# Altium footprint library texas.PCBLIB: 168 footprints (part 9 of 14)
Each footprint in its own frame and in the unit in brackets; x right, y up, seen from the top. Pads: shape width x height; smd on the part's side, far side on the other; paste and mask are expansions set on the pad; w line width, h text height; cw(c..) or ccw(c..) is an arc to the next point about the centre after c.
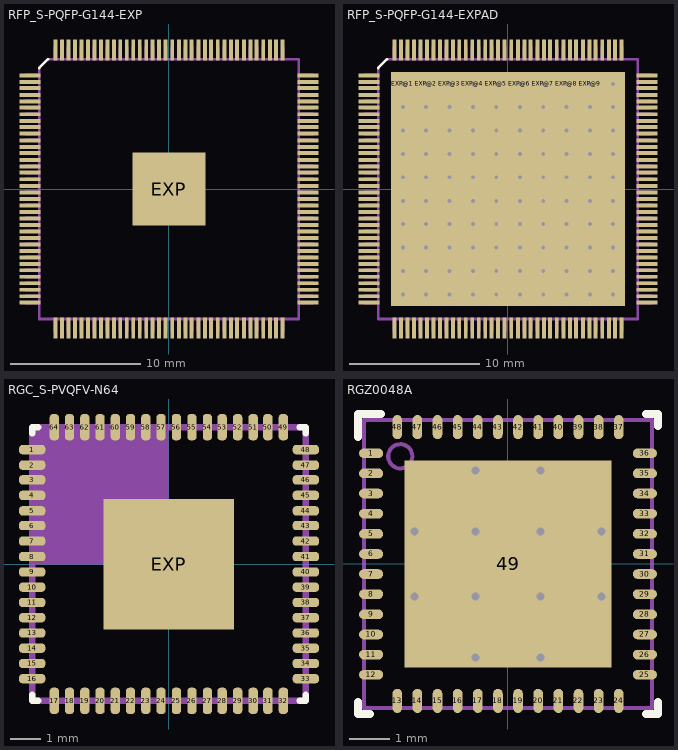
[diagram p8: the footprints below, top view; thin cyan lines are the x and y axes]

## RFP_S-PQFP-G144-EXP [mil]
pads (145):
  rect 63x12 smd: 1(-421.26,345) 2(-421.26,325) 3(-421.26,306) 4(-421.26,286) 5(-421.26,266) 6(-421.26,247) 7(-421.26,227) 8(-421.26,207) 9(-421.26,188) 10(-421.26,168) 11(-421.26,148) 12(-421.26,128) 13(-421.26,109) 14(-421.26,89) 15(-421.26,69) 16(-421.26,50) 17(-421.26,30) 18(-421.26,10) 19(-421.26,-9.84) 20(-421.26,-29.53) 21(-421.26,-49.21) 22(-421.26,-68.9) 23(-421.26,-88.58) 24(-421.26,-108.27) 25(-421.26,-127.95) 26(-421.26,-147.64) 27(-421.26,-167.32) 28(-421.26,-187.01) 29(-421.26,-206.69) 30(-421.26,-226.38) 31(-421.26,-246.06) 32(-421.26,-265.75) 33(-421.26,-285.43) 34(-421.26,-305.12) 35(-421.26,-324.8) 36(-421.26,-344.49) 73(422,-344.49) 74(422,-324.8) 75(422,-305.12) 76(422,-285.43) 77(422,-265.75) 78(422,-246.06) 79(422,-226.38) 80(422,-206.69) 81(422,-187.01) 82(422,-167.32) 83(422,-147.64) 84(422,-127.95) 85(422,-108.27) 86(422,-88.58) 87(422,-68.9) 88(422,-49.21) 89(422,-29.53) 90(422,-9.84) 91(422,10) 92(422,30) 93(422,50) 94(422,69) 95(422,89) 96(422,109) 97(422,128) 98(422,148) 99(422,168) 100(422,188) 101(422,207) 102(422,227) 103(422,247) 104(422,266) 105(422,286) 106(422,306) 107(422,325) 108(422,345)
  rect 12x63 smd: 37(-344.49,-421.26) 38(-324.8,-421.26) 39(-305.12,-421.26) 40(-285.43,-421.26) 41(-265.75,-421.26) 42(-246.06,-421.26) 43(-226.38,-421.26) 44(-206.69,-421.26) 45(-187.01,-421.26) 46(-167.32,-421.26) 47(-147.64,-421.26) 48(-127.95,-421.26) 49(-108.27,-421.26) 50(-88.58,-421.26) 51(-68.9,-421.26) 52(-49.21,-421.26) 53(-29.53,-421.26) 54(-9.84,-421.26) 55(10,-421.26) 56(30,-421.26) 57(50,-421.26) 58(69,-421.26) 59(89,-421.26) 60(109,-421.26) 61(128,-421.26) 62(148,-421.26) 63(168,-421.26) 64(188,-421.26) 65(207,-421.26) 66(227,-421.26) 67(247,-421.26) 68(266,-421.26) 69(286,-421.26) 70(306,-421.26) 71(325,-421.26) 72(345,-421.26) 109(345,422) 110(325,422) 111(306,422) 112(286,422) 113(266,422) 114(247,422) 115(227,422) 116(207,422) 117(188,422) 118(168,422) 119(148,422) 120(128,422) 121(109,422) 122(89,422) 123(69,422) 124(50,422) 125(30,422) 126(10,422) 127(-9.84,422) 128(-29.53,422) 129(-49.21,422) 130(-68.9,422) 131(-88.58,422) 132(-108.27,422) 133(-127.95,422) 134(-147.64,422) 135(-167.32,422) 136(-187.01,422) 137(-206.69,422) 138(-226.38,422) 139(-246.06,422) 140(-265.75,422) 141(-285.43,422) 142(-305.12,422) 143(-324.8,422) 144(-344.49,422)
  rect 221x221 smd: EXP(0,0)
Top Overlay:
  lines w8: -393.64,367 -366.14,394
Top Paste:
  rectangle: -108.27,-108.27 109,110
  region: -349.49,451.53 -349.49,392.47 -339.49,392.47 -339.49,451.53
  region: -329.8,451.53 -329.8,392.47 -319.8,392.47 -319.8,451.53
  region: -310.12,451.53 -310.12,392.47 -300.12,392.47 -300.12,451.53
  region: -290.43,451.53 -290.43,392.47 -280.43,392.47 -280.43,451.53
  region: -270.75,451.53 -270.75,392.47 -260.75,392.47 -260.75,451.53
  region: -251.06,451.53 -251.06,392.47 -241.06,392.47 -241.06,451.53
  region: -231.38,451.53 -231.38,392.47 -221.38,392.47 -221.38,451.53
  region: -211.69,451.53 -211.69,392.47 -201.69,392.47 -201.69,451.53
  region: -192.01,451.53 -192.01,392.47 -182.01,392.47 -182.01,451.53
  region: -172.32,451.53 -172.32,392.47 -162.32,392.47 -162.32,451.53
  region: -152.64,451.53 -152.64,392.47 -142.64,392.47 -142.64,451.53
  region: -132.95,451.53 -132.95,392.47 -122.95,392.47 -122.95,451.53
  region: -113.27,451.53 -113.27,392.47 -103.27,392.47 -103.27,451.53
  region: -93.58,451.53 -93.58,392.47 -83.58,392.47 -83.58,451.53
  region: -73.9,451.53 -73.9,392.47 -63.9,392.47 -63.9,451.53
  region: -54.21,451.53 -54.21,392.47 -44.21,392.47 -44.21,451.53
  region: -34.53,451.53 -34.53,392.47 -24.53,392.47 -24.53,451.53
  region: -14.69,451.69 -14.69,392.31 -4.69,392.31 -4.69,451.69
  region: 5.16,451.84 5.16,392.16 15.16,392.16 15.16,451.84
  region: 25,452 25,392 35,392 35,452
  region: 44.5,451.5 44.5,392.5 54.5,392.5 54.5,451.5
  region: 64.5,451.5 64.5,392.5 74.5,392.5 74.5,451.5
  region: 84.5,451.5 84.5,392.5 94.5,392.5 94.5,451.5
  region: 103.5,451.5 103.5,392.5 113.5,392.5 113.5,451.5
  region: 123.5,451.5 123.5,392.5 133.5,392.5 133.5,451.5
  region: 143.5,451.5 143.5,392.5 153.5,392.5 153.5,451.5
  region: 162.5,451.5 162.5,392.5 172.5,392.5 172.5,451.5
  region: 182.5,451.5 182.5,392.5 192.5,392.5 192.5,451.5
  region: 202.5,451.5 202.5,392.5 212.5,392.5 212.5,451.5
  region: 221.5,451.5 221.5,392.5 231.5,392.5 231.5,451.5
  region: 241.5,451.5 241.5,392.5 251.5,392.5 251.5,451.5
  region: 261.5,451.5 261.5,392.5 271.5,392.5 271.5,451.5
  region: 280.5,451.5 280.5,392.5 290.5,392.5 290.5,451.5
  region: 300.5,451.5 300.5,392.5 310.5,392.5 310.5,451.5
  region: 320.5,451.5 320.5,392.5 330.5,392.5 330.5,451.5
  region: 340,452 340,392 350,392 350,452
  region: 451,350 392,350 392,340 451,340
  region: 451,330 392,330 392,320 451,320
  region: 451,311 392,311 392,301 451,301
  region: 451,291 392,291 392,281 451,281
  region: 451,271 392,271 392,261 451,261
  region: 451,251 392,251 392,242 451,242
  region: 451,232 392,232 392,222 451,222
  region: 451,212 392,212 392,202 451,202
  region: 451,192 392,192 392,183 451,183
  region: 451,173 392,173 392,163 451,163
  region: 451,153 392,153 392,143 451,143
  region: 451,133 392,133 392,124 451,124
  region: 451,114 392,114 392,104 451,104
  region: 451,94 392,94 392,84 451,84
  region: 451,74 392,74 392,64 451,64
  region: 451,55 392,55 392,45 451,45
  region: 451,35 392,35 392,25 451,25
  region: 451,15 392,15 392,5 451,5
  region: 451,-4.92 392,-4.92 392,-14.76 451,-14.76
  region: 451,-24.61 392,-24.61 392,-34.45 451,-34.45
  region: 451,-44.29 392,-44.29 392,-54.13 451,-54.13
  region: 451,-63.98 392,-63.98 392,-73.82 451,-73.82
  region: 451,-83.66 392,-83.66 392,-93.5 451,-93.5
  region: 451,-103.35 392,-103.35 392,-113.19 451,-113.19
  region: 451,-123.03 392,-123.03 392,-132.87 451,-132.87
  region: 451,-142.72 392,-142.72 392,-152.56 451,-152.56
  region: 451,-162.4 392,-162.4 392,-172.24 451,-172.24
  region: 451,-182.09 392,-182.09 392,-191.93 451,-191.93
  region: 451,-201.77 392,-201.77 392,-211.61 451,-211.61
  region: 451,-221.46 392,-221.46 392,-231.3 451,-231.3
  region: 451,-241.14 392,-241.14 392,-250.98 451,-250.98
  region: 451,-260.83 392,-260.83 392,-270.67 451,-270.67
  region: 451,-280.51 392,-280.51 392,-290.35 451,-290.35
  region: 451,-300.2 392,-300.2 392,-310.04 451,-310.04
  region: 451,-319.88 392,-319.88 392,-329.72 451,-329.72
  region: 451,-339.57 392,-339.57 392,-349.41 451,-349.41
  region: 349.92,-451.26 349.92,-391.26 340.08,-391.26 340.08,-451.26
  region: 330.42,-450.76 330.42,-391.76 320.58,-391.76 320.58,-450.76
  region: 310.42,-450.76 310.42,-391.76 300.58,-391.76 300.58,-450.76
  region: 290.42,-450.76 290.42,-391.76 280.58,-391.76 280.58,-450.76
  region: 271.42,-450.76 271.42,-391.76 261.58,-391.76 261.58,-450.76
  region: 251.42,-450.76 251.42,-391.76 241.58,-391.76 241.58,-450.76
  region: 231.42,-450.76 231.42,-391.76 221.58,-391.76 221.58,-450.76
  region: 212.42,-450.76 212.42,-391.76 202.58,-391.76 202.58,-450.76
  region: 192.42,-450.76 192.42,-391.76 182.58,-391.76 182.58,-450.76
  region: 172.42,-450.76 172.42,-391.76 162.58,-391.76 162.58,-450.76
  region: 153.42,-450.76 153.42,-391.76 143.58,-391.76 143.58,-450.76
  region: 133.42,-450.76 133.42,-391.76 123.58,-391.76 123.58,-450.76
  region: 113.42,-450.76 113.42,-391.76 103.58,-391.76 103.58,-450.76
  region: 94.42,-450.76 94.42,-391.76 84.58,-391.76 84.58,-450.76
  region: 74.42,-450.76 74.42,-391.76 64.58,-391.76 64.58,-450.76
  region: 54.42,-450.76 54.42,-391.76 44.58,-391.76 44.58,-450.76
  region: 34.92,-451.26 34.92,-391.26 25.08,-391.26 25.08,-451.26
  region: 15.08,-451.1 15.08,-391.42 5.24,-391.42 5.24,-451.1
  region: -4.76,-450.94 -4.76,-391.57 -14.61,-391.57 -14.61,-450.94
  region: -24.61,-450.79 -24.61,-391.73 -34.45,-391.73 -34.45,-450.79
  region: -44.29,-450.79 -44.29,-391.73 -54.13,-391.73 -54.13,-450.79
  region: -63.98,-450.79 -63.98,-391.73 -73.82,-391.73 -73.82,-450.79
  region: -83.66,-450.79 -83.66,-391.73 -93.5,-391.73 -93.5,-450.79
  region: -103.35,-450.79 -103.35,-391.73 -113.19,-391.73 -113.19,-450.79
  region: -123.03,-450.79 -123.03,-391.73 -132.87,-391.73 -132.87,-450.79
  region: -142.72,-450.79 -142.72,-391.73 -152.56,-391.73 -152.56,-450.79
  region: -162.4,-450.79 -162.4,-391.73 -172.24,-391.73 -172.24,-450.79
  region: -182.09,-450.79 -182.09,-391.73 -191.93,-391.73 -191.93,-450.79
  region: -201.77,-450.79 -201.77,-391.73 -211.61,-391.73 -211.61,-450.79
  region: -221.46,-450.79 -221.46,-391.73 -231.3,-391.73 -231.3,-450.79
  region: -241.14,-450.79 -241.14,-391.73 -250.98,-391.73 -250.98,-450.79
  region: -260.83,-450.79 -260.83,-391.73 -270.67,-391.73 -270.67,-450.79
  region: -280.51,-450.79 -280.51,-391.73 -290.35,-391.73 -290.35,-450.79
  region: -300.2,-450.79 -300.2,-391.73 -310.04,-391.73 -310.04,-450.79
  region: -319.88,-450.79 -319.88,-391.73 -329.72,-391.73 -329.72,-450.79
  region: -339.57,-450.79 -339.57,-391.73 -349.41,-391.73 -349.41,-450.79
  rectangle: -450.79,-349.41 -391.73,-339.57
  rectangle: -450.79,-329.72 -391.73,-319.88
  rectangle: -450.79,-310.04 -391.73,-300.2
  rectangle: -450.79,-290.35 -391.73,-280.51
  rectangle: -450.79,-270.67 -391.73,-260.83
  rectangle: -450.79,-250.98 -391.73,-241.14
  rectangle: -450.79,-231.3 -391.73,-221.46
  rectangle: -450.79,-211.61 -391.73,-201.77
  rectangle: -450.79,-191.93 -391.73,-182.09
  rectangle: -450.79,-172.24 -391.73,-162.4
  rectangle: -450.79,-152.56 -391.73,-142.72
  rectangle: -450.79,-132.87 -391.73,-123.03
  rectangle: -450.79,-113.19 -391.73,-103.35
  rectangle: -450.79,-93.5 -391.73,-83.66
  rectangle: -450.79,-73.82 -391.73,-63.98
  rectangle: -450.79,-54.13 -391.73,-44.29
  rectangle: -450.79,-34.45 -391.73,-24.61
  rectangle: -450.79,-14.76 -391.73,-4.92
  rectangle: -450.79,5 -391.73,15
  rectangle: -450.79,25 -391.73,35
  rectangle: -450.79,45 -391.73,55
  rectangle: -450.79,64 -391.73,74
  rectangle: -450.79,84 -391.73,94
  rectangle: -450.79,104 -391.73,114
  rectangle: -450.79,124 -391.73,133
  rectangle: -450.79,143 -391.73,153
  rectangle: -450.79,163 -391.73,173
  rectangle: -450.79,183 -391.73,192
  rectangle: -450.79,202 -391.73,212
  rectangle: -450.79,222 -391.73,232
  rectangle: -450.79,242 -391.73,251
  rectangle: -450.79,261 -391.73,271
  rectangle: -450.79,281 -391.73,291
  rectangle: -450.79,301 -391.73,311
  rectangle: -450.79,320 -391.73,330
  rectangle: -450.79,340 -391.73,350
Top Solder:
  rectangle: -114.17,-114.17 115,115
  region: -351.49,454.97 -351.49,389.03 -337.49,389.03 -337.49,454.97
  region: -331.8,454.97 -331.8,389.03 -317.8,389.03 -317.8,454.97
  region: -312.12,454.97 -312.12,389.03 -298.12,389.03 -298.12,454.97
  region: -292.43,454.97 -292.43,389.03 -278.43,389.03 -278.43,454.97
  region: -272.75,454.97 -272.75,389.03 -258.75,389.03 -258.75,454.97
  region: -253.06,454.97 -253.06,389.03 -239.06,389.03 -239.06,454.97
  region: -233.38,454.97 -233.38,389.03 -219.38,389.03 -219.38,454.97
  region: -213.69,454.97 -213.69,389.03 -199.69,389.03 -199.69,454.97
  region: -194.01,454.97 -194.01,389.03 -180.01,389.03 -180.01,454.97
  region: -174.32,454.97 -174.32,389.03 -160.32,389.03 -160.32,454.97
  region: -154.64,454.97 -154.64,389.03 -140.64,389.03 -140.64,454.97
  region: -134.95,454.97 -134.95,389.03 -120.95,389.03 -120.95,454.97
  region: -115.27,454.97 -115.27,389.03 -101.27,389.03 -101.27,454.97
  region: -95.58,454.97 -95.58,389.03 -81.58,389.03 -81.58,454.97
  region: -75.9,454.97 -75.9,389.03 -61.9,389.03 -61.9,454.97
  region: -56.21,454.97 -56.21,389.03 -42.21,389.03 -42.21,454.97
  region: -36.25,455.25 -36.25,388.75 -22.25,388.75 -22.25,455.25
  region: -16.41,455.41 -16.41,388.59 -2.41,388.59 -2.41,455.41
  region: 2.94,455.06 2.94,388.94 16.94,388.94 16.94,455.06
  region: 22.78,455.22 22.78,388.78 36.78,388.78 36.78,455.22
  region: 43,455 43,389 57,389 57,455
  region: 62,455 62,389 76,389 76,455
  region: 82,455 82,389 96,389 96,455
  region: 102,455 102,389 116,389 116,455
  region: 121,455 121,389 135,389 135,455
  region: 141,455 141,389 155,389 155,455
  region: 161,455 161,389 175,389 175,455
  region: 180.5,454.5 180.5,389.5 194.5,389.5 194.5,454.5
  region: 200,455 200,389 214,389 214,455
  region: 220,455 220,389 234,389 234,455
  region: 240,455 240,389 254,389 254,455
  region: 259,455 259,389 273,389 273,455
  region: 279,455 279,389 293,389 293,455
  region: 299,455 299,389 313,389 313,455
  region: 318,455 318,389 332,389 332,455
  region: 338,455 338,389 352,389 352,455
  region: 455,352 389,352 389,338 455,338
  region: 455,332 389,332 389,318 455,318
  region: 455,313 389,313 389,299 455,299
  region: 455,293 389,293 389,279 455,279
  region: 455,273 389,273 389,259 455,259
  region: 455,253 389,253 389,240 455,240
  region: 455,234 389,234 389,220 455,220
  region: 455,214 389,214 389,200 455,200
  region: 455,194 389,194 389,181 455,181
  region: 455,175 389,175 389,161 455,161
  region: 455,155 389,155 389,141 455,141
  region: 455,135 389,135 389,122 455,122
  region: 455,116 389,116 389,102 455,102
  region: 455,96 389,96 389,82 455,82
  region: 455,76 389,76 389,63 455,63
  region: 455,57 389,57 389,43 455,43
  region: 455,37 389,37 389,23 455,23
  region: 455,17 389,17 389,3 455,3
  region: 455,-2.95 389,-2.95 389,-16.73 455,-16.73
  region: 455,-22.64 389,-22.64 389,-36.42 455,-36.42
  region: 455,-42.32 389,-42.32 389,-56.1 455,-56.1
  region: 455,-62.01 389,-62.01 389,-75.79 455,-75.79
  region: 455,-81.69 389,-81.69 389,-95.47 455,-95.47
  region: 455,-101.38 389,-101.38 389,-115.16 455,-115.16
  region: 455,-121.06 389,-121.06 389,-134.84 455,-134.84
  region: 455,-140.75 389,-140.75 389,-154.53 455,-154.53
  region: 455,-160.43 389,-160.43 389,-174.21 455,-174.21
  region: 455,-180.12 389,-180.12 389,-193.9 455,-193.9
  region: 455,-199.8 389,-199.8 389,-213.58 455,-213.58
  region: 455,-219.49 389,-219.49 389,-233.27 455,-233.27
  region: 455,-239.17 389,-239.17 389,-252.95 455,-252.95
  region: 455,-258.86 389,-258.86 389,-272.64 455,-272.64
  region: 455,-278.54 389,-278.54 389,-292.32 455,-292.32
  region: 455,-298.23 389,-298.23 389,-312.01 455,-312.01
  region: 455,-317.91 389,-317.91 389,-331.69 455,-331.69
  region: 455,-337.6 389,-337.6 389,-351.38 455,-351.38
  region: 351.89,-454.75 351.89,-388.75 338.11,-388.75 338.11,-454.75
  region: 331.89,-454.75 331.89,-388.75 318.11,-388.75 318.11,-454.75
  region: 312.89,-454.75 312.89,-388.75 299.11,-388.75 299.11,-454.75
  region: 292.89,-454.75 292.89,-388.75 279.11,-388.75 279.11,-454.75
  region: 272.89,-454.75 272.89,-388.75 259.11,-388.75 259.11,-454.75
  region: 253.89,-454.75 253.89,-388.75 240.11,-388.75 240.11,-454.75
  region: 233.89,-454.75 233.89,-388.75 220.11,-388.75 220.11,-454.75
  region: 213.89,-454.75 213.89,-388.75 200.11,-388.75 200.11,-454.75
  region: 194.39,-454.25 194.39,-389.25 180.61,-389.25 180.61,-454.25
  region: 174.89,-454.75 174.89,-388.75 161.11,-388.75 161.11,-454.75
  region: 154.89,-454.75 154.89,-388.75 141.11,-388.75 141.11,-454.75
  region: 134.89,-454.75 134.89,-388.75 121.11,-388.75 121.11,-454.75
  region: 115.89,-454.75 115.89,-388.75 102.11,-388.75 102.11,-454.75
  region: 95.89,-454.75 95.89,-388.75 82.11,-388.75 82.11,-454.75
  region: 75.89,-454.75 75.89,-388.75 62.11,-388.75 62.11,-454.75
  region: 56.89,-454.75 56.89,-388.75 43.11,-388.75 43.11,-454.75
  region: 36.67,-454.97 36.67,-388.53 22.89,-388.53 22.89,-454.97
  region: 16.82,-454.82 16.82,-388.69 3.05,-388.69 3.05,-454.82
  region: -2.52,-455.16 -2.52,-388.34 -16.3,-388.34 -16.3,-455.16
  region: -22.36,-455 -22.36,-388.5 -36.14,-388.5 -36.14,-455
  region: -42.32,-454.72 -42.32,-388.78 -56.1,-388.78 -56.1,-454.72
  region: -62.01,-454.72 -62.01,-388.78 -75.79,-388.78 -75.79,-454.72
  region: -81.69,-454.72 -81.69,-388.78 -95.47,-388.78 -95.47,-454.72
  region: -101.38,-454.72 -101.38,-388.78 -115.16,-388.78 -115.16,-454.72
  region: -121.06,-454.72 -121.06,-388.78 -134.84,-388.78 -134.84,-454.72
  region: -140.75,-454.72 -140.75,-388.78 -154.53,-388.78 -154.53,-454.72
  region: -160.43,-454.72 -160.43,-388.78 -174.21,-388.78 -174.21,-454.72
  region: -180.12,-454.72 -180.12,-388.78 -193.9,-388.78 -193.9,-454.72
  region: -199.8,-454.72 -199.8,-388.78 -213.58,-388.78 -213.58,-454.72
  region: -219.49,-454.72 -219.49,-388.78 -233.27,-388.78 -233.27,-454.72
  region: -239.17,-454.72 -239.17,-388.78 -252.95,-388.78 -252.95,-454.72
  region: -258.86,-454.72 -258.86,-388.78 -272.64,-388.78 -272.64,-454.72
  region: -278.54,-454.72 -278.54,-388.78 -292.32,-388.78 -292.32,-454.72
  region: -298.23,-454.72 -298.23,-388.78 -312.01,-388.78 -312.01,-454.72
  region: -317.91,-454.72 -317.91,-388.78 -331.69,-388.78 -331.69,-454.72
  region: -337.6,-454.72 -337.6,-388.78 -351.38,-388.78 -351.38,-454.72
  rectangle: -454.72,-351.38 -388.78,-337.6
  rectangle: -454.72,-331.69 -388.78,-317.91
  rectangle: -454.72,-312.01 -388.78,-298.23
  rectangle: -454.72,-292.32 -388.78,-278.54
  rectangle: -454.72,-272.64 -388.78,-258.86
  rectangle: -454.72,-252.95 -388.78,-239.17
  rectangle: -454.72,-233.27 -388.78,-219.49
  rectangle: -454.72,-213.58 -388.78,-199.8
  rectangle: -454.72,-193.9 -388.78,-180.12
  rectangle: -454.72,-174.21 -388.78,-160.43
  rectangle: -454.72,-154.53 -388.78,-140.75
  rectangle: -454.72,-134.84 -388.78,-121.06
  rectangle: -454.72,-115.16 -388.78,-101.38
  rectangle: -454.72,-95.47 -388.78,-81.69
  rectangle: -454.72,-75.79 -388.78,-62.01
  rectangle: -454.72,-56.1 -388.78,-42.32
  rectangle: -454.72,-36.42 -388.78,-22.64
  rectangle: -454.72,-16.73 -388.78,-2.95
  rectangle: -454.72,3 -388.78,17
  rectangle: -454.72,23 -388.78,37
  rectangle: -454.72,43 -388.78,57
  rectangle: -454.72,63 -388.78,76
  rectangle: -454.72,82 -388.78,96
  rectangle: -454.72,102 -388.78,116
  rectangle: -454.72,122 -388.78,135
  rectangle: -454.72,141 -388.78,155
  rectangle: -454.72,161 -388.78,175
  rectangle: -454.72,181 -388.78,194
  rectangle: -454.72,200 -388.78,214
  rectangle: -454.72,220 -388.78,234
  rectangle: -454.72,240 -388.78,253
  rectangle: -454.72,259 -388.78,273
  rectangle: -454.72,279 -388.78,293
  rectangle: -454.72,299 -388.78,313
  rectangle: -454.72,318 -388.78,332
  rectangle: -454.72,338 -388.78,352
Mechanical 4:
  drawing of 220 lines, arcs and shapes, not listed

## RFP_S-PQFP-G144-EXPAD [mil]
pads (244):
  rect 63x12 smd: 1(-421.26,345) 2(-421.26,325) 3(-421.26,306) 4(-421.26,286) 5(-421.26,266) 6(-421.26,247) 7(-421.26,227) 8(-421.26,207) 9(-421.26,188) 10(-421.26,168) 11(-421.26,148) 12(-421.26,128) 13(-421.26,109) 14(-421.26,89) 15(-421.26,69) 16(-421.26,50) 17(-421.26,30) 18(-421.26,10) 19(-421.26,-9.84) 20(-421.26,-29.53) 21(-421.26,-49.21) 22(-421.26,-68.9) 23(-421.26,-88.58) 24(-421.26,-108.27) 25(-421.26,-127.95) 26(-421.26,-147.64) 27(-421.26,-167.32) 28(-421.26,-187.01) 29(-421.26,-206.69) 30(-421.26,-226.38) 31(-421.26,-246.06) 32(-421.26,-265.75) 33(-421.26,-285.43) 34(-421.26,-305.12) 35(-421.26,-324.8) 36(-421.26,-344.49) 73(422,-344.49) 74(422,-324.8) 75(422,-305.12) 76(422,-285.43) 77(422,-265.75) 78(422,-246.06) 79(422,-226.38) 80(422,-206.69) 81(422,-187.01) 82(422,-167.32) 83(422,-147.64) 84(422,-127.95) 85(422,-108.27) 86(422,-88.58) 87(422,-68.9) 88(422,-49.21) 89(422,-29.53) 90(422,-9.84) 91(422,10) 92(422,30) 93(422,50) 94(422,69) 95(422,89) 96(422,109) 97(422,128) 98(422,148) 99(422,168) 100(422,188) 101(422,207) 102(422,227) 103(422,247) 104(422,266) 105(422,286) 106(422,306) 107(422,325) 108(422,345)
  rect 12x63 smd: 37(-344.49,-421.26) 38(-324.8,-421.26) 39(-305.12,-421.26) 40(-285.43,-421.26) 41(-265.75,-421.26) 42(-246.06,-421.26) 43(-226.38,-421.26) 44(-206.69,-421.26) 45(-187.01,-421.26) 46(-167.32,-421.26) 47(-147.64,-421.26) 48(-127.95,-421.26) 49(-108.27,-421.26) 50(-88.58,-421.26) 51(-68.9,-421.26) 52(-49.21,-421.26) 53(-29.53,-421.26) 54(-9.84,-421.26) 55(10,-421.26) 56(30,-421.26) 57(50,-421.26) 58(69,-421.26) 59(89,-421.26) 60(109,-421.26) 61(128,-421.26) 62(148,-421.26) 63(168,-421.26) 64(188,-421.26) 65(207,-421.26) 66(227,-421.26) 67(247,-421.26) 68(266,-421.26) 69(286,-421.26) 70(306,-421.26) 71(325,-421.26) 72(345,-421.26) 109(345,422) 110(325,422) 111(306,422) 112(286,422) 113(266,422) 114(247,422) 115(227,422) 116(207,422) 117(188,422) 118(168,422) 119(148,422) 120(128,422) 121(109,422) 122(89,422) 123(69,422) 124(50,422) 125(30,422) 126(10,422) 127(-9.84,422) 128(-29.53,422) 129(-49.21,422) 130(-68.9,422) 131(-88.58,422) 132(-108.27,422) 133(-127.95,422) 134(-147.64,422) 135(-167.32,422) 136(-187.01,422) 137(-206.69,422) 138(-226.38,422) 139(-246.06,422) 140(-265.75,422) 141(-285.43,422) 142(-305.12,422) 143(-324.8,422) 144(-344.49,422)
  rect 71x71 hole 12: EXP@1(-318.9,319) EXP@2(-248.03,319) EXP@3(-177.17,319) EXP@4(-106.3,319) EXP@5(-35.43,319) EXP@6(36,319) EXP@7(107,319) EXP@8(178,319) EXP@9(249,319) EXP@10(319,319) EXP@11(-318.9,249) EXP@12(-248.03,249) EXP@13(-177.17,249) EXP@14(-106.3,249) EXP@15(-35.43,249) EXP@16(36,249) EXP@17(107,249) EXP@18(178,249) EXP@19(249,249) EXP@20(319,249) EXP@21(-318.9,178) EXP@22(-248.03,178) EXP@23(-177.17,178) EXP@24(-106.3,178) EXP@25(-35.43,178) EXP@26(36,178) EXP@27(107,178) EXP@28(178,178) EXP@29(249,178) EXP@30(319,178) EXP@31(-318.9,107) EXP@32(-248.03,107) EXP@33(-177.17,107) EXP@34(-106.3,107) EXP@35(-35.43,107) EXP@36(36,107) EXP@37(107,107) EXP@38(178,107) EXP@39(249,107) EXP@40(319,107) EXP@41(-318.9,36) EXP@42(-248.03,36) EXP@43(-177.17,36) EXP@44(-106.3,36) EXP@45(-35.43,36) EXP@46(36,36) EXP@47(107,36) EXP@48(178,36) EXP@49(249,36) EXP@50(319,36) EXP@51(-318.9,-35.43) EXP@52(-248.03,-35.43) EXP@53(-177.17,-35.43) EXP@54(-106.3,-35.43) EXP@55(-35.43,-35.43) EXP@56(36,-35.43) EXP@57(107,-35.43) EXP@58(178,-35.43) EXP@59(249,-35.43) EXP@60(319,-35.43) EXP@61(-318.9,-106.3) EXP@62(-248.03,-106.3) EXP@63(-177.17,-106.3) EXP@64(-106.3,-106.3) EXP@65(-35.43,-106.3) EXP@66(36,-106.3) EXP@67(107,-106.3) EXP@68(178,-106.3) EXP@69(249,-106.3) EXP@70(319,-106.3) EXP@71(-318.9,-177.17) EXP@72(-248.03,-177.17) EXP@73(-177.17,-177.17) EXP@74(-106.3,-177.17) EXP@75(-35.43,-177.17) EXP@76(36,-177.17) EXP@77(107,-177.17) EXP@78(178,-177.17) EXP@79(249,-177.17) EXP@80(319,-177.17) EXP@81(-318.9,-248.03) EXP@82(-248.03,-248.03) EXP@83(-177.17,-248.03) EXP@84(-106.3,-248.03) EXP@85(-35.43,-248.03) EXP@86(36,-248.03) EXP@87(107,-248.03) EXP@88(178,-248.03) EXP@89(249,-248.03) EXP@90(319,-248.03) EXP@91(-318.9,-318.9) EXP@92(-248.03,-318.9) EXP@93(-177.17,-318.9) EXP@94(-106.3,-318.9) EXP@95(-35.43,-318.9) EXP@96(36,-318.9) EXP@97(107,-318.9) EXP@98(178,-318.9) EXP@99(249,-318.9) EXP@100(319,-318.9)
Top Overlay:
  lines w8: -393.64,367 -366.14,394
Top Paste:
  rectangle: -108.27,-108.27 109,110
  region: -349.49,451.53 -349.49,392.47 -339.49,392.47 -339.49,451.53
  region: -329.8,451.53 -329.8,392.47 -319.8,392.47 -319.8,451.53
  region: -310.12,451.53 -310.12,392.47 -300.12,392.47 -300.12,451.53
  region: -290.43,451.53 -290.43,392.47 -280.43,392.47 -280.43,451.53
  region: -270.75,451.53 -270.75,392.47 -260.75,392.47 -260.75,451.53
  region: -251.06,451.53 -251.06,392.47 -241.06,392.47 -241.06,451.53
  region: -231.38,451.53 -231.38,392.47 -221.38,392.47 -221.38,451.53
  region: -211.69,451.53 -211.69,392.47 -201.69,392.47 -201.69,451.53
  region: -192.01,451.53 -192.01,392.47 -182.01,392.47 -182.01,451.53
  region: -172.32,451.53 -172.32,392.47 -162.32,392.47 -162.32,451.53
  region: -152.64,451.53 -152.64,392.47 -142.64,392.47 -142.64,451.53
  region: -132.95,451.53 -132.95,392.47 -122.95,392.47 -122.95,451.53
  region: -113.27,451.53 -113.27,392.47 -103.27,392.47 -103.27,451.53
  region: -93.58,451.53 -93.58,392.47 -83.58,392.47 -83.58,451.53
  region: -73.9,451.53 -73.9,392.47 -63.9,392.47 -63.9,451.53
  region: -54.21,451.53 -54.21,392.47 -44.21,392.47 -44.21,451.53
  region: -34.53,451.53 -34.53,392.47 -24.53,392.47 -24.53,451.53
  region: -14.69,451.69 -14.69,392.31 -4.69,392.31 -4.69,451.69
  region: 5.16,451.84 5.16,392.16 15.16,392.16 15.16,451.84
  region: 25,452 25,392 35,392 35,452
  region: 44.5,451.5 44.5,392.5 54.5,392.5 54.5,451.5
  region: 64.5,451.5 64.5,392.5 74.5,392.5 74.5,451.5
  region: 84.5,451.5 84.5,392.5 94.5,392.5 94.5,451.5
  region: 103.5,451.5 103.5,392.5 113.5,392.5 113.5,451.5
  region: 123.5,451.5 123.5,392.5 133.5,392.5 133.5,451.5
  region: 143.5,451.5 143.5,392.5 153.5,392.5 153.5,451.5
  region: 162.5,451.5 162.5,392.5 172.5,392.5 172.5,451.5
  region: 182.5,451.5 182.5,392.5 192.5,392.5 192.5,451.5
  region: 202.5,451.5 202.5,392.5 212.5,392.5 212.5,451.5
  region: 221.5,451.5 221.5,392.5 231.5,392.5 231.5,451.5
  region: 241.5,451.5 241.5,392.5 251.5,392.5 251.5,451.5
  region: 261.5,451.5 261.5,392.5 271.5,392.5 271.5,451.5
  region: 280.5,451.5 280.5,392.5 290.5,392.5 290.5,451.5
  region: 300.5,451.5 300.5,392.5 310.5,392.5 310.5,451.5
  region: 320.5,451.5 320.5,392.5 330.5,392.5 330.5,451.5
  region: 340,452 340,392 350,392 350,452
  region: 451,350 392,350 392,340 451,340
  region: 451,330 392,330 392,320 451,320
  region: 451,311 392,311 392,301 451,301
  region: 451,291 392,291 392,281 451,281
  region: 451,271 392,271 392,261 451,261
  region: 451,251 392,251 392,242 451,242
  region: 451,232 392,232 392,222 451,222
  region: 451,212 392,212 392,202 451,202
  region: 451,192 392,192 392,183 451,183
  region: 451,173 392,173 392,163 451,163
  region: 451,153 392,153 392,143 451,143
  region: 451,133 392,133 392,124 451,124
  region: 451,114 392,114 392,104 451,104
  region: 451,94 392,94 392,84 451,84
  region: 451,74 392,74 392,64 451,64
  region: 451,55 392,55 392,45 451,45
  region: 451,35 392,35 392,25 451,25
  region: 451,15 392,15 392,5 451,5
  region: 451,-4.92 392,-4.92 392,-14.76 451,-14.76
  region: 451,-24.61 392,-24.61 392,-34.45 451,-34.45
  region: 451,-44.29 392,-44.29 392,-54.13 451,-54.13
  region: 451,-63.98 392,-63.98 392,-73.82 451,-73.82
  region: 451,-83.66 392,-83.66 392,-93.5 451,-93.5
  region: 451,-103.35 392,-103.35 392,-113.19 451,-113.19
  region: 451,-123.03 392,-123.03 392,-132.87 451,-132.87
  region: 451,-142.72 392,-142.72 392,-152.56 451,-152.56
  region: 451,-162.4 392,-162.4 392,-172.24 451,-172.24
  region: 451,-182.09 392,-182.09 392,-191.93 451,-191.93
  region: 451,-201.77 392,-201.77 392,-211.61 451,-211.61
  region: 451,-221.46 392,-221.46 392,-231.3 451,-231.3
  region: 451,-241.14 392,-241.14 392,-250.98 451,-250.98
  region: 451,-260.83 392,-260.83 392,-270.67 451,-270.67
  region: 451,-280.51 392,-280.51 392,-290.35 451,-290.35
  region: 451,-300.2 392,-300.2 392,-310.04 451,-310.04
  region: 451,-319.88 392,-319.88 392,-329.72 451,-329.72
  region: 451,-339.57 392,-339.57 392,-349.41 451,-349.41
  region: 349.92,-451.26 349.92,-391.26 340.08,-391.26 340.08,-451.26
  region: 330.42,-450.76 330.42,-391.76 320.58,-391.76 320.58,-450.76
  region: 310.42,-450.76 310.42,-391.76 300.58,-391.76 300.58,-450.76
  region: 290.42,-450.76 290.42,-391.76 280.58,-391.76 280.58,-450.76
  region: 271.42,-450.76 271.42,-391.76 261.58,-391.76 261.58,-450.76
  region: 251.42,-450.76 251.42,-391.76 241.58,-391.76 241.58,-450.76
  region: 231.42,-450.76 231.42,-391.76 221.58,-391.76 221.58,-450.76
  region: 212.42,-450.76 212.42,-391.76 202.58,-391.76 202.58,-450.76
  region: 192.42,-450.76 192.42,-391.76 182.58,-391.76 182.58,-450.76
  region: 172.42,-450.76 172.42,-391.76 162.58,-391.76 162.58,-450.76
  region: 153.42,-450.76 153.42,-391.76 143.58,-391.76 143.58,-450.76
  region: 133.42,-450.76 133.42,-391.76 123.58,-391.76 123.58,-450.76
  region: 113.42,-450.76 113.42,-391.76 103.58,-391.76 103.58,-450.76
  region: 94.42,-450.76 94.42,-391.76 84.58,-391.76 84.58,-450.76
  region: 74.42,-450.76 74.42,-391.76 64.58,-391.76 64.58,-450.76
  region: 54.42,-450.76 54.42,-391.76 44.58,-391.76 44.58,-450.76
  region: 34.92,-451.26 34.92,-391.26 25.08,-391.26 25.08,-451.26
  region: 15.08,-451.1 15.08,-391.42 5.24,-391.42 5.24,-451.1
  region: -4.76,-450.94 -4.76,-391.57 -14.61,-391.57 -14.61,-450.94
  region: -24.61,-450.79 -24.61,-391.73 -34.45,-391.73 -34.45,-450.79
  region: -44.29,-450.79 -44.29,-391.73 -54.13,-391.73 -54.13,-450.79
  region: -63.98,-450.79 -63.98,-391.73 -73.82,-391.73 -73.82,-450.79
  region: -83.66,-450.79 -83.66,-391.73 -93.5,-391.73 -93.5,-450.79
  region: -103.35,-450.79 -103.35,-391.73 -113.19,-391.73 -113.19,-450.79
  region: -123.03,-450.79 -123.03,-391.73 -132.87,-391.73 -132.87,-450.79
  region: -142.72,-450.79 -142.72,-391.73 -152.56,-391.73 -152.56,-450.79
  region: -162.4,-450.79 -162.4,-391.73 -172.24,-391.73 -172.24,-450.79
  region: -182.09,-450.79 -182.09,-391.73 -191.93,-391.73 -191.93,-450.79
  region: -201.77,-450.79 -201.77,-391.73 -211.61,-391.73 -211.61,-450.79
  region: -221.46,-450.79 -221.46,-391.73 -231.3,-391.73 -231.3,-450.79
  region: -241.14,-450.79 -241.14,-391.73 -250.98,-391.73 -250.98,-450.79
  region: -260.83,-450.79 -260.83,-391.73 -270.67,-391.73 -270.67,-450.79
  region: -280.51,-450.79 -280.51,-391.73 -290.35,-391.73 -290.35,-450.79
  region: -300.2,-450.79 -300.2,-391.73 -310.04,-391.73 -310.04,-450.79
  region: -319.88,-450.79 -319.88,-391.73 -329.72,-391.73 -329.72,-450.79
  region: -339.57,-450.79 -339.57,-391.73 -349.41,-391.73 -349.41,-450.79
  rectangle: -450.79,-349.41 -391.73,-339.57
  rectangle: -450.79,-329.72 -391.73,-319.88
  rectangle: -450.79,-310.04 -391.73,-300.2
  rectangle: -450.79,-290.35 -391.73,-280.51
  rectangle: -450.79,-270.67 -391.73,-260.83
  rectangle: -450.79,-250.98 -391.73,-241.14
  rectangle: -450.79,-231.3 -391.73,-221.46
  rectangle: -450.79,-211.61 -391.73,-201.77
  rectangle: -450.79,-191.93 -391.73,-182.09
  rectangle: -450.79,-172.24 -391.73,-162.4
  rectangle: -450.79,-152.56 -391.73,-142.72
  rectangle: -450.79,-132.87 -391.73,-123.03
  rectangle: -450.79,-113.19 -391.73,-103.35
  rectangle: -450.79,-93.5 -391.73,-83.66
  rectangle: -450.79,-73.82 -391.73,-63.98
  rectangle: -450.79,-54.13 -391.73,-44.29
  rectangle: -450.79,-34.45 -391.73,-24.61
  rectangle: -450.79,-14.76 -391.73,-4.92
  rectangle: -450.79,5 -391.73,15
  rectangle: -450.79,25 -391.73,35
  rectangle: -450.79,45 -391.73,55
  rectangle: -450.79,64 -391.73,74
  rectangle: -450.79,84 -391.73,94
  rectangle: -450.79,104 -391.73,114
  rectangle: -450.79,124 -391.73,133
  rectangle: -450.79,143 -391.73,153
  rectangle: -450.79,163 -391.73,173
  rectangle: -450.79,183 -391.73,192
  rectangle: -450.79,202 -391.73,212
  rectangle: -450.79,222 -391.73,232
  rectangle: -450.79,242 -391.73,251
  rectangle: -450.79,261 -391.73,271
  rectangle: -450.79,281 -391.73,291
  rectangle: -450.79,301 -391.73,311
  rectangle: -450.79,320 -391.73,330
  rectangle: -450.79,340 -391.73,350
Top Solder:
  rectangle: -114.17,-114.17 115,115
  region: -351.49,454.97 -351.49,389.03 -337.49,389.03 -337.49,454.97
  region: -331.8,454.97 -331.8,389.03 -317.8,389.03 -317.8,454.97
  region: -312.12,454.97 -312.12,389.03 -298.12,389.03 -298.12,454.97
  region: -292.43,454.97 -292.43,389.03 -278.43,389.03 -278.43,454.97
  region: -272.75,454.97 -272.75,389.03 -258.75,389.03 -258.75,454.97
  region: -253.06,454.97 -253.06,389.03 -239.06,389.03 -239.06,454.97
  region: -233.38,454.97 -233.38,389.03 -219.38,389.03 -219.38,454.97
  region: -213.69,454.97 -213.69,389.03 -199.69,389.03 -199.69,454.97
  region: -194.01,454.97 -194.01,389.03 -180.01,389.03 -180.01,454.97
  region: -174.32,454.97 -174.32,389.03 -160.32,389.03 -160.32,454.97
  region: -154.64,454.97 -154.64,389.03 -140.64,389.03 -140.64,454.97
  region: -134.95,454.97 -134.95,389.03 -120.95,389.03 -120.95,454.97
  region: -115.27,454.97 -115.27,389.03 -101.27,389.03 -101.27,454.97
  region: -95.58,454.97 -95.58,389.03 -81.58,389.03 -81.58,454.97
  region: -75.9,454.97 -75.9,389.03 -61.9,389.03 -61.9,454.97
  region: -56.21,454.97 -56.21,389.03 -42.21,389.03 -42.21,454.97
  region: -36.25,455.25 -36.25,388.75 -22.25,388.75 -22.25,455.25
  region: -16.41,455.41 -16.41,388.59 -2.41,388.59 -2.41,455.41
  region: 2.94,455.06 2.94,388.94 16.94,388.94 16.94,455.06
  region: 22.78,455.22 22.78,388.78 36.78,388.78 36.78,455.22
  region: 43,455 43,389 57,389 57,455
  region: 62,455 62,389 76,389 76,455
  region: 82,455 82,389 96,389 96,455
  region: 102,455 102,389 116,389 116,455
  region: 121,455 121,389 135,389 135,455
  region: 141,455 141,389 155,389 155,455
  region: 161,455 161,389 175,389 175,455
  region: 180.5,454.5 180.5,389.5 194.5,389.5 194.5,454.5
  region: 200,455 200,389 214,389 214,455
  region: 220,455 220,389 234,389 234,455
  region: 240,455 240,389 254,389 254,455
  region: 259,455 259,389 273,389 273,455
  region: 279,455 279,389 293,389 293,455
  region: 299,455 299,389 313,389 313,455
  region: 318,455 318,389 332,389 332,455
  region: 338,455 338,389 352,389 352,455
  region: 455,352 389,352 389,338 455,338
  region: 455,332 389,332 389,318 455,318
  region: 455,313 389,313 389,299 455,299
  region: 455,293 389,293 389,279 455,279
  region: 455,273 389,273 389,259 455,259
  region: 455,253 389,253 389,240 455,240
  region: 455,234 389,234 389,220 455,220
  region: 455,214 389,214 389,200 455,200
  region: 455,194 389,194 389,181 455,181
  region: 455,175 389,175 389,161 455,161
  region: 455,155 389,155 389,141 455,141
  region: 455,135 389,135 389,122 455,122
  region: 455,116 389,116 389,102 455,102
  region: 455,96 389,96 389,82 455,82
  region: 455,76 389,76 389,63 455,63
  region: 455,57 389,57 389,43 455,43
  region: 455,37 389,37 389,23 455,23
  region: 455,17 389,17 389,3 455,3
  region: 455,-2.95 389,-2.95 389,-16.73 455,-16.73
  region: 455,-22.64 389,-22.64 389,-36.42 455,-36.42
  region: 455,-42.32 389,-42.32 389,-56.1 455,-56.1
  region: 455,-62.01 389,-62.01 389,-75.79 455,-75.79
  region: 455,-81.69 389,-81.69 389,-95.47 455,-95.47
  region: 455,-101.38 389,-101.38 389,-115.16 455,-115.16
  region: 455,-121.06 389,-121.06 389,-134.84 455,-134.84
  region: 455,-140.75 389,-140.75 389,-154.53 455,-154.53
  region: 455,-160.43 389,-160.43 389,-174.21 455,-174.21
  region: 455,-180.12 389,-180.12 389,-193.9 455,-193.9
  region: 455,-199.8 389,-199.8 389,-213.58 455,-213.58
  region: 455,-219.49 389,-219.49 389,-233.27 455,-233.27
  region: 455,-239.17 389,-239.17 389,-252.95 455,-252.95
  region: 455,-258.86 389,-258.86 389,-272.64 455,-272.64
  region: 455,-278.54 389,-278.54 389,-292.32 455,-292.32
  region: 455,-298.23 389,-298.23 389,-312.01 455,-312.01
  region: 455,-317.91 389,-317.91 389,-331.69 455,-331.69
  region: 455,-337.6 389,-337.6 389,-351.38 455,-351.38
  region: 351.89,-454.75 351.89,-388.75 338.11,-388.75 338.11,-454.75
  region: 331.89,-454.75 331.89,-388.75 318.11,-388.75 318.11,-454.75
  region: 312.89,-454.75 312.89,-388.75 299.11,-388.75 299.11,-454.75
  region: 292.89,-454.75 292.89,-388.75 279.11,-388.75 279.11,-454.75
  region: 272.89,-454.75 272.89,-388.75 259.11,-388.75 259.11,-454.75
  region: 253.89,-454.75 253.89,-388.75 240.11,-388.75 240.11,-454.75
  region: 233.89,-454.75 233.89,-388.75 220.11,-388.75 220.11,-454.75
  region: 213.89,-454.75 213.89,-388.75 200.11,-388.75 200.11,-454.75
  region: 194.39,-454.25 194.39,-389.25 180.61,-389.25 180.61,-454.25
  region: 174.89,-454.75 174.89,-388.75 161.11,-388.75 161.11,-454.75
  region: 154.89,-454.75 154.89,-388.75 141.11,-388.75 141.11,-454.75
  region: 134.89,-454.75 134.89,-388.75 121.11,-388.75 121.11,-454.75
  region: 115.89,-454.75 115.89,-388.75 102.11,-388.75 102.11,-454.75
  region: 95.89,-454.75 95.89,-388.75 82.11,-388.75 82.11,-454.75
  region: 75.89,-454.75 75.89,-388.75 62.11,-388.75 62.11,-454.75
  region: 56.89,-454.75 56.89,-388.75 43.11,-388.75 43.11,-454.75
  region: 36.67,-454.97 36.67,-388.53 22.89,-388.53 22.89,-454.97
  region: 16.82,-454.82 16.82,-388.69 3.05,-388.69 3.05,-454.82
  region: -2.52,-455.16 -2.52,-388.34 -16.3,-388.34 -16.3,-455.16
  region: -22.36,-455 -22.36,-388.5 -36.14,-388.5 -36.14,-455
  region: -42.32,-454.72 -42.32,-388.78 -56.1,-388.78 -56.1,-454.72
  region: -62.01,-454.72 -62.01,-388.78 -75.79,-388.78 -75.79,-454.72
  region: -81.69,-454.72 -81.69,-388.78 -95.47,-388.78 -95.47,-454.72
  region: -101.38,-454.72 -101.38,-388.78 -115.16,-388.78 -115.16,-454.72
  region: -121.06,-454.72 -121.06,-388.78 -134.84,-388.78 -134.84,-454.72
  region: -140.75,-454.72 -140.75,-388.78 -154.53,-388.78 -154.53,-454.72
  region: -160.43,-454.72 -160.43,-388.78 -174.21,-388.78 -174.21,-454.72
  region: -180.12,-454.72 -180.12,-388.78 -193.9,-388.78 -193.9,-454.72
  region: -199.8,-454.72 -199.8,-388.78 -213.58,-388.78 -213.58,-454.72
  region: -219.49,-454.72 -219.49,-388.78 -233.27,-388.78 -233.27,-454.72
  region: -239.17,-454.72 -239.17,-388.78 -252.95,-388.78 -252.95,-454.72
  region: -258.86,-454.72 -258.86,-388.78 -272.64,-388.78 -272.64,-454.72
  region: -278.54,-454.72 -278.54,-388.78 -292.32,-388.78 -292.32,-454.72
  region: -298.23,-454.72 -298.23,-388.78 -312.01,-388.78 -312.01,-454.72
  region: -317.91,-454.72 -317.91,-388.78 -331.69,-388.78 -331.69,-454.72
  region: -337.6,-454.72 -337.6,-388.78 -351.38,-388.78 -351.38,-454.72
  rectangle: -454.72,-351.38 -388.78,-337.6
  rectangle: -454.72,-331.69 -388.78,-317.91
  rectangle: -454.72,-312.01 -388.78,-298.23
  rectangle: -454.72,-292.32 -388.78,-278.54
  rectangle: -454.72,-272.64 -388.78,-258.86
  rectangle: -454.72,-252.95 -388.78,-239.17
  rectangle: -454.72,-233.27 -388.78,-219.49
  rectangle: -454.72,-213.58 -388.78,-199.8
  rectangle: -454.72,-193.9 -388.78,-180.12
  rectangle: -454.72,-174.21 -388.78,-160.43
  rectangle: -454.72,-154.53 -388.78,-140.75
  rectangle: -454.72,-134.84 -388.78,-121.06
  rectangle: -454.72,-115.16 -388.78,-101.38
  rectangle: -454.72,-95.47 -388.78,-81.69
  rectangle: -454.72,-75.79 -388.78,-62.01
  rectangle: -454.72,-56.1 -388.78,-42.32
  rectangle: -454.72,-36.42 -388.78,-22.64
  rectangle: -454.72,-16.73 -388.78,-2.95
  rectangle: -454.72,3 -388.78,17
  rectangle: -454.72,23 -388.78,37
  rectangle: -454.72,43 -388.78,57
  rectangle: -454.72,63 -388.78,76
  rectangle: -454.72,82 -388.78,96
  rectangle: -454.72,102 -388.78,116
  rectangle: -454.72,122 -388.78,135
  rectangle: -454.72,141 -388.78,155
  rectangle: -454.72,161 -388.78,175
  rectangle: -454.72,181 -388.78,194
  rectangle: -454.72,200 -388.78,214
  rectangle: -454.72,220 -388.78,234
  rectangle: -454.72,240 -388.78,253
  rectangle: -454.72,259 -388.78,273
  rectangle: -454.72,279 -388.78,293
  rectangle: -454.72,299 -388.78,313
  rectangle: -454.72,318 -388.78,332
  rectangle: -454.72,338 -388.78,352
Mechanical 4:
  drawing of 220 lines, arcs and shapes, not listed

## RGC_S-PVQFV-N64 [mil]
pads (65):
  rrect75% 34x12 smd: 1(-176.18,148) 2(-176.18,128) 3(-176.18,109) 4(-176.18,89) 5(-176.18,69) 6(-176.18,50) 7(-176.18,30) 8(-176.18,10) 9(-176.18,-9.84) 10(-176.18,-29.53) 11(-176.18,-49.21) 12(-176.18,-68.9) 13(-176.18,-88.58) 14(-176.18,-108.27) 15(-176.18,-127.95) 16(-176.18,-147.64) 33(177,-147.64) 34(177,-127.95) 35(177,-108.27) 36(177,-88.58) 37(177,-68.9) 38(177,-49.21) 39(177,-29.53) 40(177,-9.84) 41(177,10) 42(177,30) 43(177,50) 44(177,69) 45(177,89) 46(177,109) 47(177,128) 48(177,148)
  rrect75% 12x34 smd: 17(-147.64,-176.18) 18(-127.95,-176.18) 19(-108.27,-176.18) 20(-88.58,-176.18) 21(-68.9,-176.18) 22(-49.21,-176.18) 23(-29.53,-176.18) 24(-9.84,-176.18) 25(10,-176.18) 26(30,-176.18) 27(50,-176.18) 28(69,-176.18) 29(89,-176.18) 30(109,-176.18) 31(128,-176.18) 32(148,-176.18) 49(148,177) 50(128,177) 51(109,177) 52(89,177) 53(69,177) 54(50,177) 55(30,177) 56(10,177) 57(-9.84,177) 58(-29.53,177) 59(-49.21,177) 60(-68.9,177) 61(-88.58,177) 62(-108.27,177) 63(-127.95,177) 64(-147.64,177)
  rect 168x168 smd: EXP(0,0)
Top Overlay:
  lines w8: -176.18,-168.31 -176.18,-176.18 -168.31,-176.18 ; -176.18,169 -176.18,177 -168.31,177 ; 169,-176.18 177,-176.18 177,-168.31 ; 169,177 177,177 177,169
Top Paste:
  circle w0: c-147.64,166 r5
  circle w0: c-127.95,166 r5
  circle w0: c-108.27,166 r5
  circle w0: c-88.58,166 r5
  circle w0: c-68.9,166 r5
  circle w0: c-49.21,166 r5
  circle w0: c-29.53,166 r5
  circle w0: c-9.84,166 r5
  circle w0: c10,166 r5
  circle w0: c30,166 r5
  circle w0: c50,166 r5
  circle w0: c69,166 r5
  circle w0: c89,166 r5
  circle w0: c109,166 r5
  circle w0: c128,166 r5
  circle w0: c148,166 r5
  circle w0: c166,148 r5
  circle w0: c166,128 r5
  circle w0: c166,109 r5
  circle w0: c166,89 r5
  circle w0: c166,69 r5
  circle w0: c166,50 r5
  circle w0: c166,30 r5
  circle w0: c166,10 r5
  circle w0: c166,-9.84 r5
  circle w0: c166,-29.53 r5
  circle w0: c166,-49.21 r5
  circle w0: c166,-68.9 r5
  circle w0: c166,-88.58 r5
  circle w0: c166,-108.27 r5
  circle w0: c166,-127.95 r5
  circle w0: c166,-147.64 r5
  circle w0: c148,-165.35 r5
  circle w0: c128,-165.35 r5
  circle w0: c109,-165.35 r5
  circle w0: c89,-165.35 r5
  circle w0: c69,-165.35 r5
  circle w0: c50,-165.35 r5
  circle w0: c30,-165.35 r5
  circle w0: c10,-165.35 r5
  circle w0: c-9.84,-165.35 r5
  circle w0: c-29.53,-165.35 r5
  circle w0: c-49.21,-165.35 r5
  circle w0: c-68.9,-165.35 r5
  circle w0: c-88.58,-165.35 r5
  circle w0: c-108.27,-165.35 r5
  circle w0: c-127.95,-165.35 r5
  circle w0: c-147.64,-165.35 r5
  circle w0: c-165.35,-147.64 r5
  circle w0: c-165.35,-127.95 r5
  circle w0: c-165.35,-108.27 r5
  circle w0: c-165.35,-88.58 r5
  circle w0: c-165.35,-68.9 r5
  circle w0: c-165.35,-49.21 r5
  circle w0: c-165.35,-29.53 r5
  circle w0: c-165.35,-9.84 r5
  circle w0: c-165.35,10 r5
  circle w0: c-165.35,30 r5
  circle w0: c-165.35,50 r5
  circle w0: c-165.35,69 r5
  circle w0: c-165.35,89 r5
  circle w0: c-165.35,109 r5
  circle w0: c-165.35,128 r5
  circle w0: c-165.35,148 r5
  rectangle: 6,6 77,77
  region: 6.07,-5.84 6.07,-76.84 76.93,-76.84 76.93,-5.84
  region: -5.91,-5.91 -76.77,-5.91 -76.77,-76.77 -5.91,-76.77
  region: -5.84,6.07 -5.84,76.93 -76.84,76.93 -76.84,6.07
  region: -152.64,190.3 -152.64,165.7 -142.64,165.7 -142.64,190.3
  region: -132.95,190.3 -132.95,165.7 -122.95,165.7 -122.95,190.3
  region: -113.27,190.3 -113.27,165.7 -103.27,165.7 -103.27,190.3
  region: -93.58,190.3 -93.58,165.7 -83.58,165.7 -83.58,190.3
  region: -73.9,190.3 -73.9,165.7 -63.9,165.7 -63.9,190.3
  region: -54.21,190.3 -54.21,165.7 -44.21,165.7 -44.21,190.3
  region: -34.53,190.3 -34.53,165.7 -24.53,165.7 -24.53,190.3
  region: -14.57,190.57 -14.57,165.43 -4.57,165.43 -4.57,190.57
  region: 5.27,190.73 5.27,165.27 15.27,165.27 15.27,190.73
  region: 25,190 25,166 35,166 35,190
  region: 44.5,190.5 44.5,165.5 54.5,165.5 54.5,190.5
  region: 64.5,190.5 64.5,165.5 74.5,165.5 74.5,190.5
  region: 84,190 84,166 94,166 94,190
  region: 103.5,190.5 103.5,165.5 113.5,165.5 113.5,190.5
  region: 123.5,190.5 123.5,165.5 133.5,165.5 133.5,190.5
  region: 143,190 143,166 153,166 153,190
  region: 190,153 166,153 166,143 190,143
  region: 190,133 166,133 166,124 190,124
  region: 190,114 166,114 166,104 190,104
  region: 190,94 166,94 166,84 190,84
  region: 190,74 166,74 166,64 190,64
  region: 190,55 166,55 166,45 190,45
  region: 190,35 166,35 166,25 190,25
  region: 190,15 166,15 166,5 190,5
  region: 190,-4.92 166,-4.92 166,-14.76 190,-14.76
  region: 190,-24.61 166,-24.61 166,-34.45 190,-34.45
  region: 190,-44.29 166,-44.29 166,-54.13 190,-54.13
  region: 190,-63.98 166,-63.98 166,-73.82 190,-73.82
  region: 190,-83.66 166,-83.66 166,-93.5 190,-93.5
  region: 190,-103.35 166,-103.35 166,-113.19 190,-113.19
  region: 190,-123.03 166,-123.03 166,-132.87 190,-132.87
  region: 190,-142.72 166,-142.72 166,-152.56 190,-152.56
  region: 152.92,-189.66 152.92,-165.66 143.08,-165.66 143.08,-189.66
  region: 133.42,-190.16 133.42,-165.16 123.58,-165.16 123.58,-190.16
  region: 113.42,-190.16 113.42,-165.16 103.58,-165.16 103.58,-190.16
  region: 93.92,-189.66 93.92,-165.66 84.08,-165.66 84.08,-189.66
  region: 74.42,-190.16 74.42,-165.16 64.58,-165.16 64.58,-190.16
  region: 54.42,-190.16 54.42,-165.16 44.58,-165.16 44.58,-190.16
  region: 34.92,-189.66 34.92,-165.66 25.08,-165.66 25.08,-189.66
  region: 15.19,-190.39 15.19,-164.93 5.35,-164.93 5.35,-190.39
  region: -4.65,-190.23 -4.65,-165.08 -14.49,-165.08 -14.49,-190.23
  region: -24.61,-189.96 -24.61,-165.35 -34.45,-165.35 -34.45,-189.96
  region: -44.29,-189.96 -44.29,-165.35 -54.13,-165.35 -54.13,-189.96
  region: -63.98,-189.96 -63.98,-165.35 -73.82,-165.35 -73.82,-189.96
  region: -83.66,-189.96 -83.66,-165.35 -93.5,-165.35 -93.5,-189.96
  region: -103.35,-189.96 -103.35,-165.35 -113.19,-165.35 -113.19,-189.96
  region: -123.03,-189.96 -123.03,-165.35 -132.87,-165.35 -132.87,-189.96
  region: -142.72,-189.96 -142.72,-165.35 -152.56,-165.35 -152.56,-189.96
  rectangle: -189.96,-152.56 -165.35,-142.72
  rectangle: -189.96,-132.87 -165.35,-123.03
  rectangle: -189.96,-113.19 -165.35,-103.35
  rectangle: -189.96,-93.5 -165.35,-83.66
  rectangle: -189.96,-73.82 -165.35,-63.98
  rectangle: -189.96,-54.13 -165.35,-44.29
  rectangle: -189.96,-34.45 -165.35,-24.61
  rectangle: -189.96,-14.76 -165.35,-4.92
  rectangle: -189.96,5 -165.35,15
  rectangle: -189.96,25 -165.35,35
  rectangle: -189.96,45 -165.35,55
  rectangle: -189.96,64 -165.35,74
  rectangle: -189.96,84 -165.35,94
  rectangle: -189.96,104 -165.35,114
  rectangle: -189.96,124 -165.35,133
  rectangle: -189.96,143 -165.35,153
Top Solder:
  drawing of 64 lines, arcs and shapes, not listed
Mechanical 4:
  rectangle: -177.17,0 0,178
  lines w8: -176.18,-176.18 -176.18,177 177,177 177,-176.18 -176.18,-176.18

## RGZ0048A [mm]
pads (49):
  oval 0.6x0.24 smd: 1(-3.4,2.75) 2(-3.4,2.25) 3(-3.4,1.75) 4(-3.4,1.25) 5(-3.4,0.75) 6(-3.4,0.25) 7(-3.4,-0.25) 8(-3.4,-0.75) 9(-3.4,-1.25) 10(-3.4,-1.75) 11(-3.4,-2.25) 12(-3.4,-2.75) 25(3.4,-2.75) 26(3.4,-2.25) 27(3.4,-1.75) 28(3.4,-1.25) 29(3.4,-0.75) 30(3.4,-0.25) 31(3.4,0.25) 32(3.4,0.75) 33(3.4,1.25) 34(3.4,1.75) 35(3.4,2.25) 36(3.4,2.75)
  oval 0.24x0.6 smd: 13(-2.75,-3.4) 14(-2.25,-3.4) 15(-1.75,-3.4) 16(-1.25,-3.4) 17(-0.75,-3.4) 18(-0.25,-3.4) 19(0.25,-3.4) 20(0.75,-3.4) 21(1.25,-3.4) 22(1.75,-3.4) 23(2.25,-3.4) 24(2.75,-3.4) 37(2.75,3.4) 38(2.25,3.4) 39(1.75,3.4) 40(1.25,3.4) 41(0.75,3.4) 42(0.25,3.4) 43(-0.25,3.4) 44(-0.75,3.4) 45(-1.25,3.4) 46(-1.75,3.4) 47(-2.25,3.4) 48(-2.75,3.4)
  rect 5.15x5.15 smd paste-2.6: 49(0,0)
via 0.804,-2.325 diameter 0.5 hole 0.2
via -0.803,-0.803 diameter 0.5 hole 0.2
via -0.803,2.325 diameter 0.5 hole 0.2
via 0.804,2.325 diameter 0.5 hole 0.2
via -2.325,0.804 diameter 0.5 hole 0.2
via -0.803,0.804 diameter 0.5 hole 0.2
via 0.804,0.804 diameter 0.5 hole 0.2
via 2.325,0.804 diameter 0.5 hole 0.2
via -2.325,-0.803 diameter 0.5 hole 0.2
via 0.804,-0.803 diameter 0.5 hole 0.2
via 2.325,-0.803 diameter 0.5 hole 0.2
via -0.803,-2.325 diameter 0.5 hole 0.2
Top Overlay:
  lines w0.2: -3.725,-3.425 -3.725,-3.725 -3.425,-3.725 ; -3.725,3.15 -3.725,3.725 -3.15,3.725 ; 3.425,-3.725 3.725,-3.725 3.725,-3.425 ; 3.425,3.725 3.725,3.725 3.725,3.425
Top Paste:
  rectangle: -0.704,-0.704 0.703,0.703
  rectangle: 0.903,-0.704 2.31,0.703
  region: -0.904,0.703 -2.311,0.703 -2.311,-0.703 -0.904,-0.703
  region: -0.904,2.31 -2.311,2.31 -2.311,0.904 -0.904,0.904
  rectangle: 0.903,0.903 2.31,2.31
  rectangle: -0.704,0.903 0.703,2.31
  rectangle: -0.704,-2.311 0.703,-0.904
  rectangle: 0.903,-2.311 2.31,-0.904
  region: -0.904,-0.904 -2.311,-0.904 -2.311,-2.31 -0.904,-2.31
Mechanical 5:
  circle w0.1: c-2.675,2.675 r0.3
  lines w0.1: -3.575,-3.575 -3.575,3.575 3.575,3.575 3.575,-3.575 -3.575,-3.575
3D body: height 1.01, standoff 0.5, extent -2.974,2.376 -2.376,2.974
3D body: height 1, standoff 0, extent -3.575,-3.575 3.575,3.575